# Altium footprint library Pasivos.PcbLib: 138 footprints (part 3 of 9)
Each footprint in its own frame and in the unit in brackets; x right, y up, seen from the top. Pads: shape width x height; smd on the part's side, far side on the other; paste and mask are expansions set on the pad; w line width, h text height; cw(c..) or ccw(c..) is an arc to the next point about the centre after c.
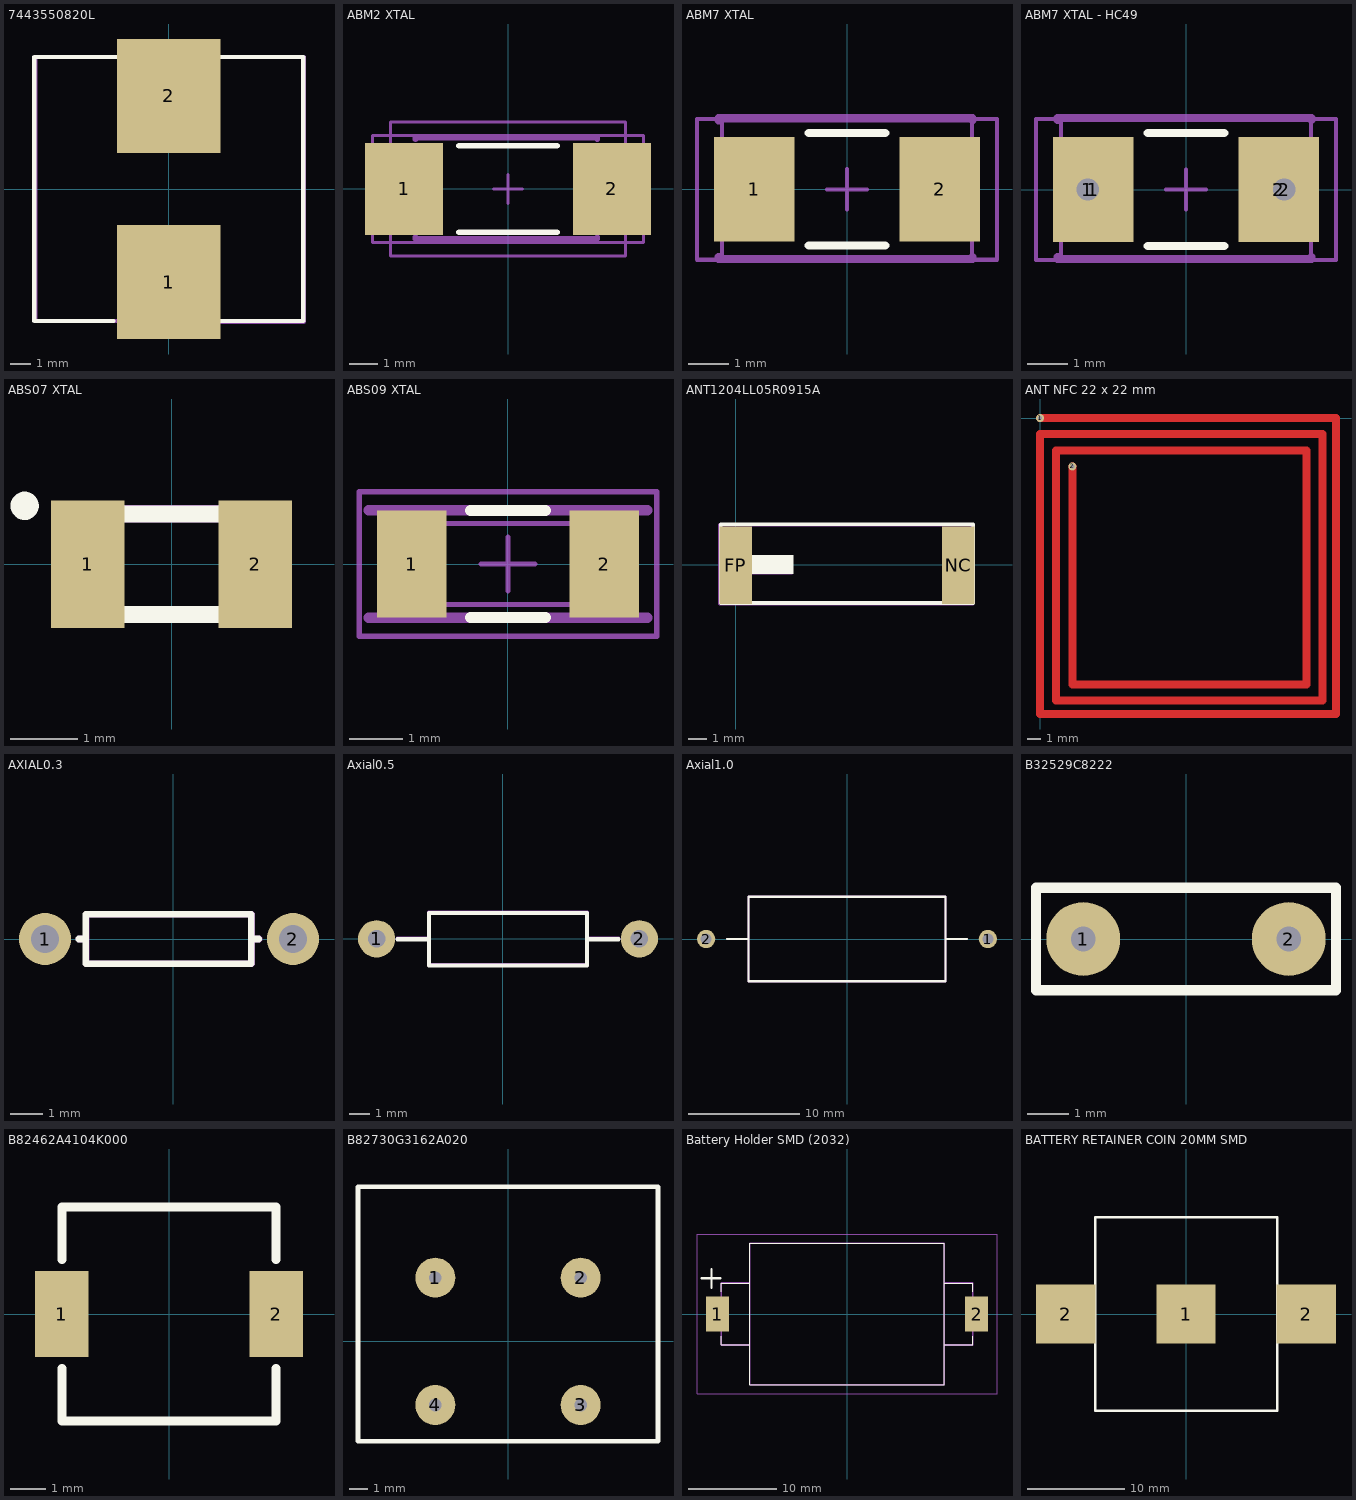
[diagram p2: the footprints below, top view; thin cyan lines are the x and y axes]

## 7443550820L [mm] "WE-HCI SMD Flat Wire High Current Inductor"
pads (2):
  rect 5x5.5 smd: 1(0,-4.5) 2(0,4.5)
Top Overlay:
  lines w0.2: -2.667,-6.375 -6.5,-6.375 -6.5,6.375 6.5,6.375 6.5,-6.375 2.5,-6.375
Mechanical 29:
  lines w0.2: -1.744,-6.388 -6.445,-6.388 -6.445,6.388 -1.744,6.388 ; 1.656,-6.416 6.528,-6.416 6.528,6.388 1.656,6.388
  text "'.Designator'" at 0.134,-2.79 h0.5
3D body "User Library-DRQ127_12_5x12_5.step": height 8, standoff 0, extent -6.35,-6.277 6.15,6.223

## ABM2 XTAL [mm] "CERAMIC SMD MICROPROCESSOR CRYSTAL"
height 0.6
pads (2):
  rect 2.7x3.2 smd: 1(-3.6,0) 2(3.6,0)
Top Overlay:
  lines w0.2: -1.7,-1.5 1.7,-1.5 ; -1.7,1.5 1.7,1.5
Mechanical 13:
  lines w0.1: -4.075,-2.325 -4.075,2.325 4.075,2.325 4.075,-2.325 -4.075,-2.325
Mechanical 15:
  lines w0.1: -0.5,0 0.5,0 ; 0,-0.5 0,0.5 ; -4.7,-1.85 -4.7,1.85 4.7,1.85 4.7,-1.85 -4.7,-1.85
Mechanical 29:
  lines w0.2: -3.21,-1.675 -3.21,-1.725 3.09,-1.725 3.09,-1.675 ; -3.21,1.725 -3.21,1.775 3.09,1.775 3.09,1.725
  text "'.Designator'" at -2.823,-0.153 h0.5
3D body: height 0.6, standoff 0, extent -4.075,-2.325 4.075,2.325

## ABM7 XTAL [mm] "CERAMIC SMD MICRO MINIATURE MICROPROCESSOR CRYSTAL"
height 0.6
pads (2):
  rect 2x2.6 smd: 1(-2.3,0) 2(2.3,0)
Top Overlay:
  lines w0.2: -0.95,-1.4 0.95,-1.4 ; -0.95,1.4 0.95,1.4
Mechanical 13:
  lines w0.1: -3.1,-1.74 -3.1,1.74 3.1,1.74 3.1,-1.74 -3.1,-1.74
Mechanical 15:
  lines w0.1: -0.5,0 0.5,0 ; 0,-0.5 0,0.5 ; -3.725,-1.75 -3.725,1.75 3.725,1.75 3.725,-1.75 -3.725,-1.75
Mechanical 29:
  lines w0.2: -3.188,-1.686 -3.188,-1.736 3.112,-1.736 3.112,-1.686 ; -3.188,1.714 -3.188,1.764 3.112,1.764 3.112,1.714
  text "'.Designator'" at -2.801,-0.164 h0.5
3D body "ABM7.step": height 1.44, standoff 0, extent -3.01,-1.74 3.09,1.76

## ABM7 XTAL - HC49 [mm] "CERAMIC SMD MICRO MINIATURE MICROPROCESSOR CRYSTAL"
height 0.6
pads (4):
  round 0.8 hole 0.55: 1(-2.44,0) 2(2.44,0)
  rect 2x2.6 smd: 1(-2.3,0) 2(2.3,0)
Top Overlay:
  lines w0.2: -0.95,-1.4 0.95,-1.4 ; -0.95,1.4 0.95,1.4
Mechanical 13:
  lines w0.1: -3.1,-1.74 -3.1,1.74 3.1,1.74 3.1,-1.74 -3.1,-1.74
Mechanical 15:
  lines w0.1: -0.5,0 0.5,0 ; 0,-0.5 0,0.5 ; -3.725,-1.75 -3.725,1.75 3.725,1.75 3.725,-1.75 -3.725,-1.75
Mechanical 29:
  lines w0.2: -3.187,-1.675 -3.187,-1.725 3.113,-1.724 3.113,-1.675 ; -3.187,1.725 -3.187,1.776 3.113,1.775 3.113,1.725
  text "'.Designator'" at -2.8,-0.153 h0.5
3D body "ABM7.step": height 1.44, standoff 0, extent -3.01,-1.74 3.09,1.76

## ABS07 XTAL [mm] "ABS07-32.768KHZ-T ABRACOM"
pads (2):
  rect 1.1x1.9 smd: 1(-1.25,0) 2(1.25,0)
Top Overlay:
  circle w0.254: c-2.193,0.871 r0.084
  lines w0.254: -1.6,-0.75 1.6,-0.75 ; -1.6,0.75 1.6,0.75
Mechanical 29:
  lines w0.254: -1.6,-0.75 -1.6,0.75 1.6,0.75 1.6,-0.75 -1.6,-0.75
  text "'.Designator'" at -0.348,-0.048 h0.5
Mechanical 30:
  lines w0.254: -1.596,-0.748 1.604,-0.748 1.604,0.752 -1.596,0.752 -1.596,-0.748
  text "'.Designator'" at -0.338,-0.077 h0.5
3D body "ABS07.STEP": height 0.89, standoff 0, extent -1.604,-0.746 1.596,0.753

## ABS09 XTAL [mm] "32.768kHz SMD LOW PROFILE CRYSTAL"
height 0.6
pads (2):
  rect 1.3x2 smd: 1(-1.8,0) 2(1.8,0)
Top Overlay:
  lines w0.2: -0.7,-1 0.7,-1 ; -0.7,1 0.7,1
Mechanical 13:
  lines w0.1: -2.055,-0.755 -2.055,0.755 2.055,0.755 2.055,-0.755 -2.055,-0.755
Mechanical 15:
  lines w0.1: -0.5,0 0.5,0 ; 0,-0.5 0,0.5 ; -2.775,-1.35 -2.775,1.35 2.775,1.35 2.775,-1.35 -2.775,-1.35
Mechanical 29:
  lines w0.2: -2.6,-1.003 2.6,-1.003 ; -2.6,1.005 2.6,1.005
  text "'.Designator'" at -0.298,-0.176 h0.5
3D body "ABS09.STEP": height 0.91, standoff 0, extent -1.933,-0.762 2.187,0.758

## ANT1204LL05R0915A [mm] "2.45 GHz SMD Chip Antenna (7mm)"
pads (2):
  rect 1.8x4.25 smd: FP(-0.005,-0.01) NC(12.2,-0.01)
Top Overlay:
  rectangle: 0.646,-0.5 3.15,0.53
  lines w0.2: -0.821,-2.09 -0.821,2.23 13.03,2.23 13.03,-2.09 -0.821,-2.09
Mechanical 29:
  rectangle: 0.597,-0.529 3.101,0.501
  lines w0.2: -0.87,-2.119 12.981,-2.119 12.981,2.201 -0.87,2.201 -0.87,-2.119
  text "'.Designator'" at 4.286,-0.201 h0.5
3D body "ANT1204LL08R0870A Ceramic Chip Antenna.step": height 1.6, standoff 0, extent 0.15,-1.98 12.25,2.12

## ANT NFC 22 x 22 mm [mm] "ANT NFC 22 x 22 mm"
pads (2):
  round 0.6 hole 0.3: 1(0,0) 2(2.4,-3.6)
Top Layer:
  lines w0.6: 0,0 22,0 22,-22 0,-22 0,-1.2 21,-1.2 21,-21 1.2,-21 1.2,-2.4 19.8,-2.4 19.8,-19.8 2.4,-19.8 2.4,-3.6
Mechanical 29:
  text "'.Designator'" at 8.158,-11.414 h0.5

## AXIAL0.3 [mm]
pads (2):
  round 1.6 hole 0.85: 1(-3.937,0) 2(3.683,0)
Top Overlay:
  lines w0.2: -2.907,0 -2.679,0 ; 2.63,0 2.401,0 ; 2.401,0 2.401,-0.762 -2.679,-0.762 -2.679,0.762 2.401,0.762 2.401,0
Mechanical 29:
  lines w0.2: -2.896,0 -2.667,0 ; 2.642,0 2.413,0 ; 2.413,0 2.413,0.762 -2.667,0.762 -2.667,-0.762 2.413,-0.762 2.413,0
  text "'.Designator'" at -2.988,-0.224 h0.5
3D body "axial0.3.step": height 2.5, standoff -1.5, extent -4.177,-0.984 3.923,1.016

## Axial0.5 [mm]
pads (2):
  round 1.8 hole 0.85: 1(-6.096,0) 2(6.604,0)
Top Overlay:
  lines w0.2: -5.08,-0.018 -3.556,-0.018 ; 4.064,-0.018 5.588,-0.018 ; -3.556,-1.288 -3.556,1.252 4.064,1.252 4.064,-1.288 -3.556,-1.288
Mechanical 29:
  lines w0.2: -5.08,0 -3.556,0 ; 4.064,0 5.588,0 ; -3.556,-1.27 4.064,-1.27 4.064,1.27 -3.556,1.27 -3.556,-1.27
  text "'.Designator'" at -3.288,-0.156 h0.5
3D body "AXIAL0_5.step": height 3.52, standoff -1, extent -6.223,-1.397 6.731,1.302

## Axial1.0 [mm]
pads (2):
  round 1.65 hole 1: 1(12.7,0) 2(-12.7,0)
Top Overlay:
  lines w0.2: -10.795,0 -8.89,0 ; 8.89,0 10.795,0 ; -8.89,-3.81 8.89,-3.81 8.89,3.81 -8.89,3.81 -8.89,-3.81
Mechanical 29:
  lines w0.2: -10.795,0 -8.89,0 ; 8.89,0 10.795,0 ; -8.89,-3.81 -8.89,3.81 8.89,3.81 8.89,-3.81 -8.89,-3.81
  text "'.Designator'" at -0.245,0.452 h0.5
3D body "axial1.step": height 7.2, standoff -2.5, extent -12.952,-3.429 12.698,3.571

## B32529C8222 [mm]
height 6.5
pads (2):
  round 1.8 hole 0.6: 1(-2.5,0) 2(2.5,0)
Top Overlay:
  lines w0.254: -3.65,-1.25 -3.65,1.25 3.65,1.25 3.65,-1.25 -3.65,-1.25
3D body "User Library-Cap-5 (7_2x6_5x2_2)Dark.step": height 7.03, standoff -3.5, extent -3.6,-1.1 3.6,1.1

## B82462A4104K000 [mm]
height 3
pads (2):
  rect 1.5x2.4 smd: 1(-3,0) 2(3,0)
Top Overlay:
  lines w0.254: -3,-1.524 -3,-3 3,-3 3,-1.524 ; -3,1.524 -3,3 3,3 3,1.524
3D body "B82462A4104K000.STEP": height 3.2, standoff 0.05, extent -3,-2.556 3,2.556

## B82730G3162A020 [mm]
height 16.5
pads (4):
  round 2.2 hole 0.7: 1(-4,3.5) 2(4,3.5) 3(4,-3.5) 4(-4,-3.5)
Top Overlay:
  lines w0.254: -8.25,-5.5 8.25,-5.5 8.25,8.509 -8.25,8.509 -8.25,-5.5
3D body "TDK_B82730G3162A020.STEP": height 12, standoff -3, extent -8.25,-5.5 8.25,8.5

## Battery Holder SMD (2032) [mm] "79527141"
pads (2):
  rect 2.6x4 smd: 1(-14.65,0) 2(14.65,0)
Top Overlay:
  lines w0.1: -14.2,-2.54 -14.2,-3.5 -11,-3.5 ; -14.2,2.54 -14.2,3.5 -11,3.5 ; 11,-3.5 14.2,-3.5 14.2,-2.54 ; 11,3.5 14.2,3.5 14.2,2.54 ; -11,-8 -11,8 11,8 11,-8 -11,-8
  lines w0.254: -16.438,4.028 -14.31,4.028 ; -15.319,2.958 -15.319,5.086
Mechanical 13:
  lines w0.2: -11,-3.5 -14.2,-3.5 -14.2,3.5 -11,3.5 ; 11,-3.5 14.2,-3.5 14.2,3.5 11,3.5 ; -11,-8 -11,8 11,8 11,-8 -11,-8
Mechanical 15:
  lines w0.1: -16.95,-9 -16.95,9 16.95,9 16.95,-9 -16.95,-9
3D body "CR2032_Holder.STEP": height 5.6, standoff 0, extent -16.08,-8.075 16.12,7.925

## BATTERY RETAINER COIN 20MM SMD [mm]
pads (3):
  rect 6.07x6.07 smd: 1(0,0) 2(-12.33,0) 2(12.33,0)
Top Overlay:
  lines w0.254: -9.29,-9.9 9.331,-9.9 9.331,9.9 -9.29,9.9 -9.29,-9.9
3D body "BATTERY RETAINER COIN 20MM SMD.step": height 3.96, standoff 0, extent -15.359,-10.112 15.375,9.941